# Altium schematic symbol library IC_ADI.SCHLIB: 3169 symbols (part 57 of 181)
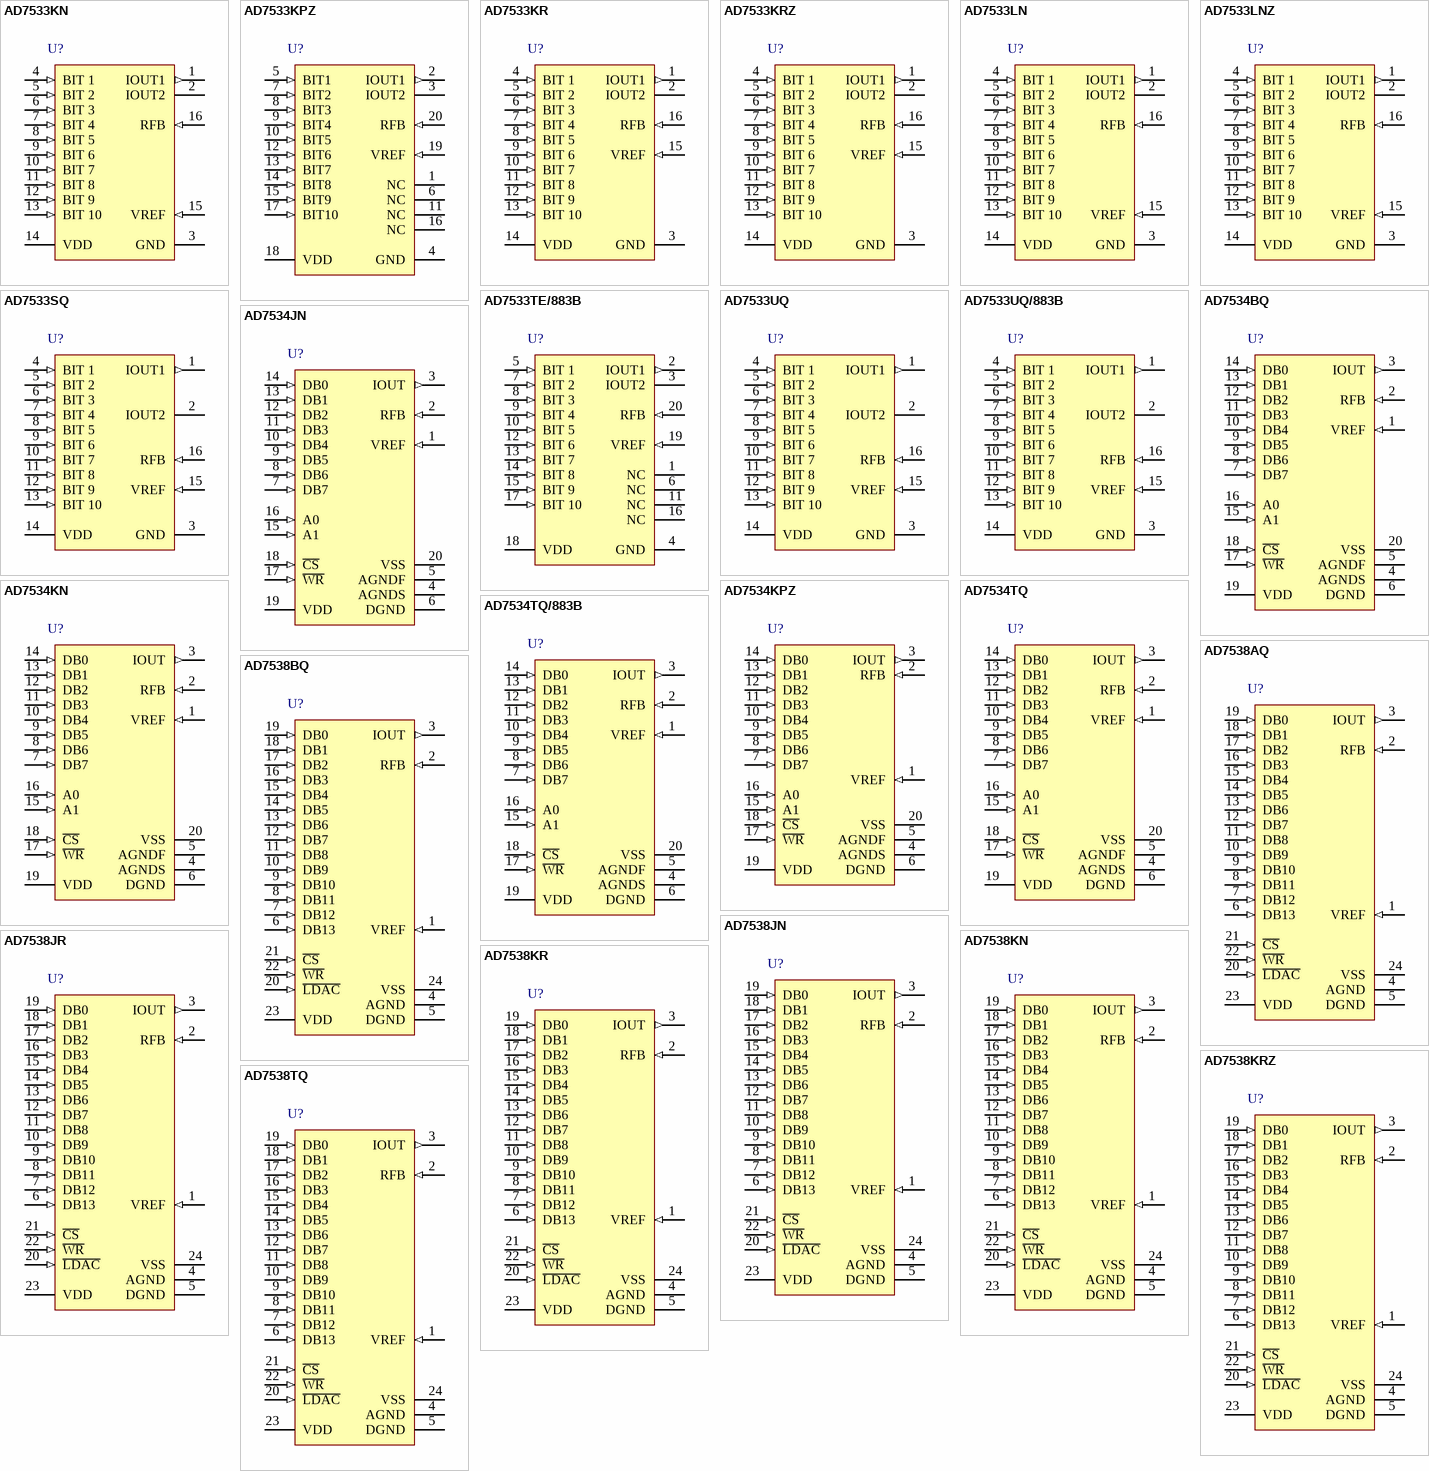
[diagram p247: symbols AD7533KN to AD7538TQ]

## AD7538TQ
designator U?
Single 14-Bit LC2MOS Microprocessor-Compatible Digital-to-Analog Converter, -55 to +125 degC, Q-24-1, Tube; Generic Part Number: AD7538; PartNumber: AD7538TQ; # DAC Outputs: 1; Max V+: 15.75V; Op Pwr Diss: 60mW; Resolution (Bits): 14; Settling Time: 1.5祍; Single Supply: No; DatasheetVersion: Rev.B; PackageVersion: 100808-A; PackageReference: Q-24-1; PackageDescription: 24-Lead Ceramic Dual In-Line Package [CERDIP]; Supplier Part Number 1: AD7538TQ-ND; Supplier Part Number 2: 09B5788; Supplier Part Number 3: 584-AD7538TQ; Packing: Tube; RoHS: N; Mounting Technology: Through Hole; ComponentLink1Description: Manufacturer URL; ComponentLink2Description: Datasheet; ComponentLink3Description: Package Specification; ComponentLink4Description: Product URL
footprint DIP24 (Footprint not found)
pins: 1 VREF (in) "Voltage Reference.", 2 RFB (in) "Feedback Resistor. Used to close the loop around an external op amp.", 3 IOUT (out) "Current Output Terminal.", 4 AGND (power) "Analog Ground", 5 DGND (power) "Digital Ground.", 6 DB13 (in) "Data Input. Bit DB13 (MSB).", 7 DB12 (in) "Data Input.", 8 DB11 (in) "Data Input.", 9 DB10 (in) "Data Input.", 10 DB9 (in) "Data Input.", 11 DB8 (in) "Data Input.", 12 DB7 (in) "Data Input.", 13 DB6 (in) "Data Input.", 14 DB5 (in) "Data Input.", 15 DB4 (in) "Data Input.", 16 DB3 (in) "Data Input.", 17 DB2 (in) "Data Input.", 18 DB1 (in) "Data Input.", 19 DB0 (in) "Data Input. Bit DB0 (LSB).", 20 ~{LDAC} (in) "Chip Select Input. Active low.", 21 ~{CS} (in) "Asynchronous Load DAC Input. Active low.", 22 ~{WR} (in) "Write Input. Active low.", 23 VDD (power) "+12 V to +15 V Supply Input.", 24 VSS (power) "Bias pin for high temperature low leakage configuration. To implement low leakage system, the pin should be at a negative voltage. See Figure 6 and Figure 8 for recommended circuitry."

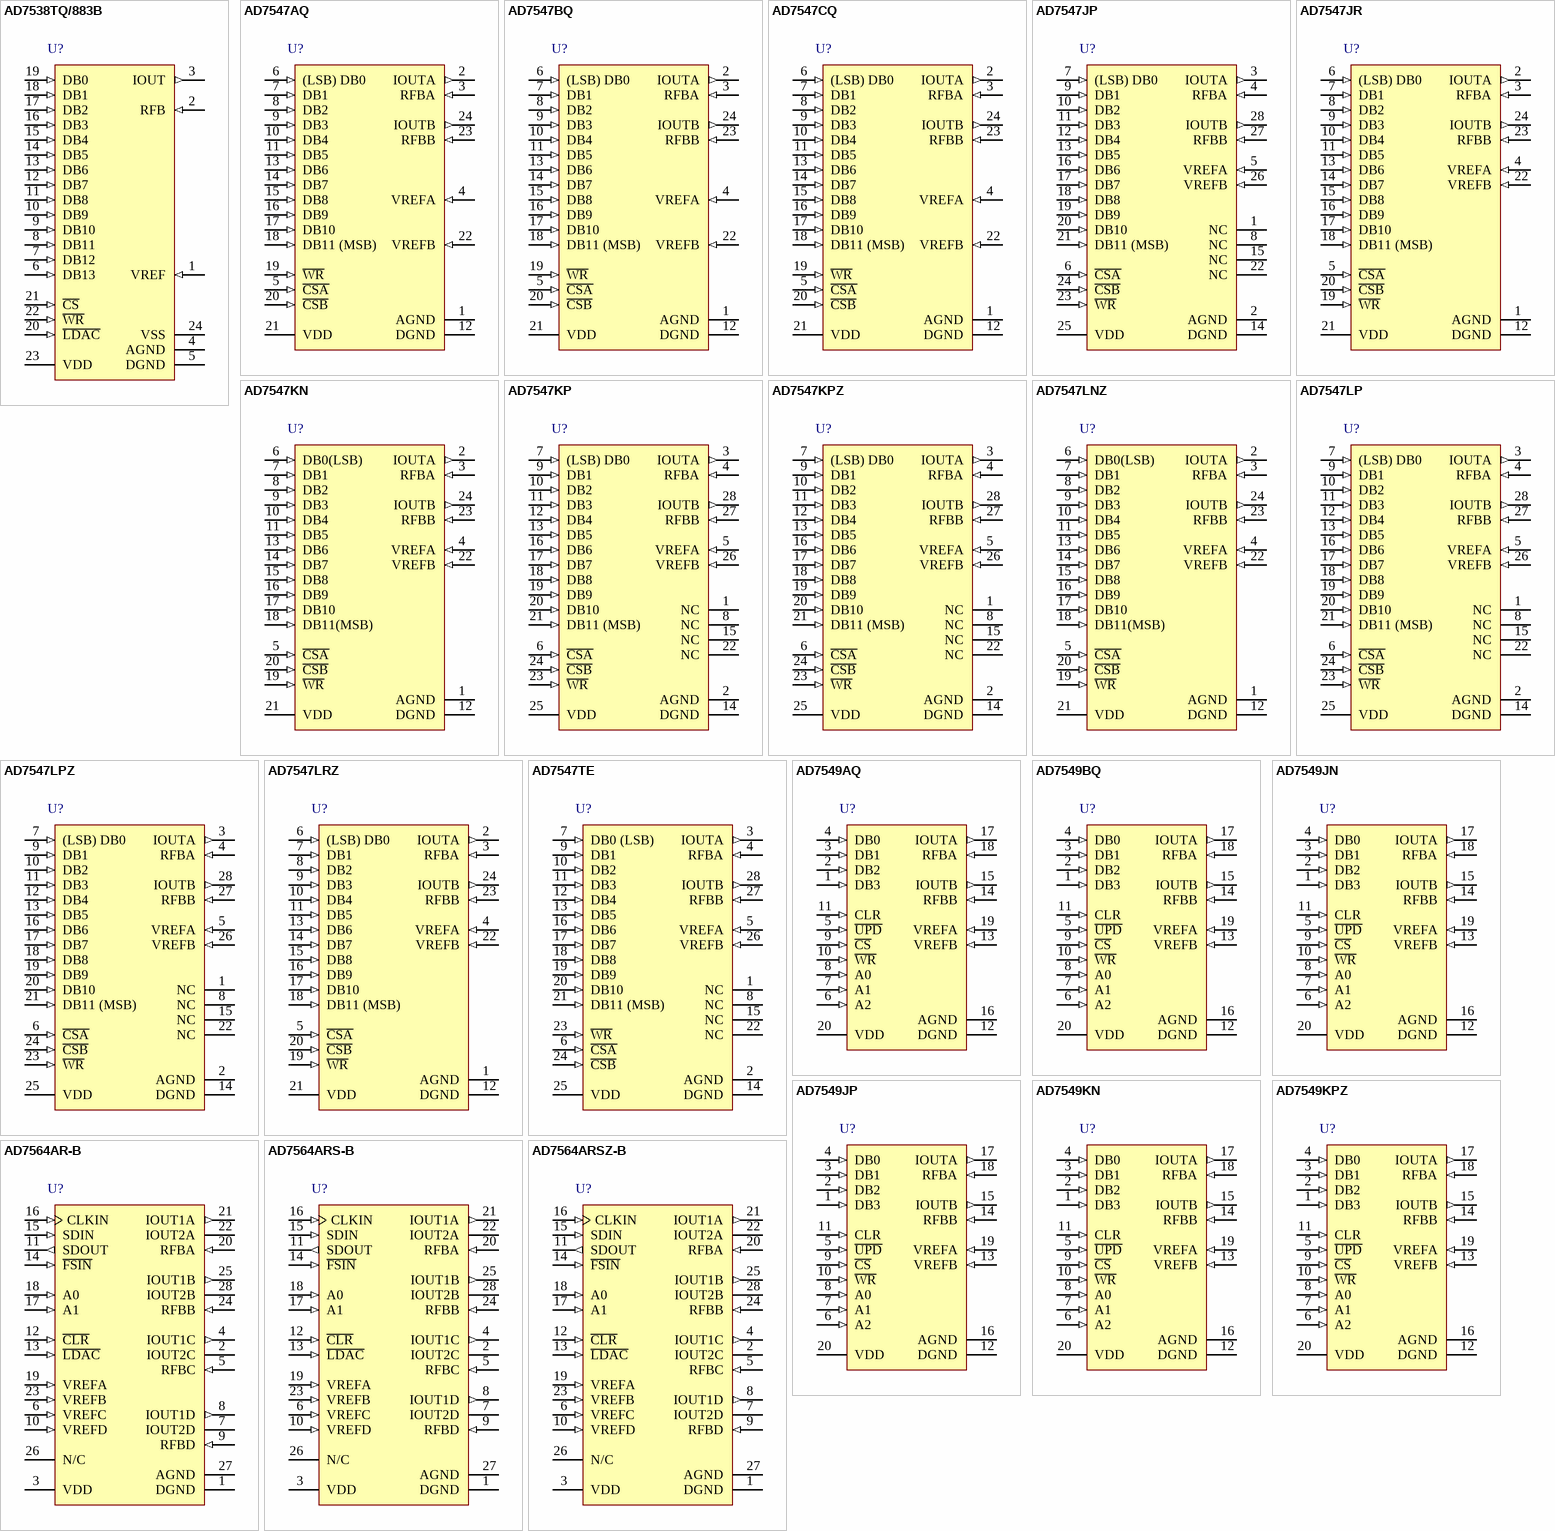
[diagram p48: symbols AD7538TQ/883B to AD7564ARSZ-B]

## AD7538TQ/883B
designator U?
Single 14-Bit LC2MOS Microprocessor-Compatible Digital-to-Analog Converter, -55 to +125 degC, Q-24-1, Tube; Generic Part Number: AD7538; PartNumber: AD7538TQ/883B; # DAC Outputs: 1; Max V+: 15.75V; Op Pwr Diss: 60mW; Resolution (Bits): 14; Settling Time: 1.5祍; Single Supply: No; DatasheetVersion: Rev.B; PackageVersion: 100808-A; PackageReference: Q-24-1; PackageDescription: 24-Lead Ceramic Dual In-Line Package [CERDIP]; Supplier Part Number 1: 584-AD7538TQ883B; Packing: Tube; RoHS: N; Mounting Technology: Through Hole; ComponentLink1Description: Manufacturer URL; ComponentLink2Description: Datasheet; ComponentLink3Description: Package Specification; ComponentLink4Description: Product URL
footprint DIP24 (Footprint not found)
pins: 1 VREF (in) "Voltage Reference.", 2 RFB (in) "Feedback Resistor. Used to close the loop around an external op amp.", 3 IOUT (out) "Current Output Terminal.", 4 AGND (power) "Analog Ground", 5 DGND (power) "Digital Ground.", 6 DB13 (in) "Data Input. Bit DB13 (MSB).", 7 DB12 (in) "Data Input.", 8 DB11 (in) "Data Input.", 9 DB10 (in) "Data Input.", 10 DB9 (in) "Data Input.", 11 DB8 (in) "Data Input.", 12 DB7 (in) "Data Input.", 13 DB6 (in) "Data Input.", 14 DB5 (in) "Data Input.", 15 DB4 (in) "Data Input.", 16 DB3 (in) "Data Input.", 17 DB2 (in) "Data Input.", 18 DB1 (in) "Data Input.", 19 DB0 (in) "Data Input. Bit DB0 (LSB).", 20 ~{LDAC} (in) "Chip Select Input. Active low.", 21 ~{CS} (in) "Asynchronous Load DAC Input. Active low.", 22 ~{WR} (in) "Write Input. Active low.", 23 VDD (power) "+12 V to +15 V Supply Input.", 24 VSS (power) "Bias pin for high temperature low leakage configuration. To implement low leakage system, the pin should be at a negative voltage. See Figure 6 and Figure 8 for recommended circuitry."

## AD7547AQ
designator U?
Dual 12-Bit LC2MOS Digital-to-Analog Converter with Parallel Loading, -40 to +85 degC, Q-24-1, Tube; Generic Part Number: AD7547; PartNumber: AD7547AQ; # DAC Outputs: 2; Max V+: 16.5V; Op Pwr Diss: 30mW; Resolution (Bits): 12; Settling Time: 1.5祍; Single Supply: Yes; DatasheetVersion: Rev.A; PackageVersion: 100808-A; PackageReference: Q-24-1; PackageDescription: 24-Lead Ceramic Dual In-Line Package [CERDIP]; Supplier Part Number 1: AD7547AQ-ND; Supplier Part Number 2: 584-AD7547AQ; Packing: Tube; RoHS: N; Mounting Technology: Through Hole; ComponentLink1Description: Manufacturer URL; ComponentLink2Description: Datasheet; ComponentLink3Description: Package Specification; ComponentLink4Description: Product URL
footprint DIP24 (Footprint not found)
pins: 1 AGND (power) "Analog Ground.", 2 IOUTA (out) "Current output terminal of DACA.", 3 RFBA (in) "Feedback resistor for DACA.", 4 VREFA (in) "Reference input to DACA.", 5 ~{CSA} (in) "Chip Select Input for DACA. Active low.", 6 (LSB) DB0 (in) "Data input.", 7 DB1 (in) "Data input.", 8 DB2 (in) "Data input.", 9 DB3 (in) "Data input.", 10 DB4 (in) "Data input.", 11 DB5 (in) "Data input.", 12 DGND (power) "Digital Ground.", 13 DB6 (in) "Data input.", 14 DB7 (in) "Data input.", 15 DB8 (in) "Data input.", 16 DB9 (in) "Data input.", 17 DB10 (in) "Data input.", 18 DB11 (MSB) (in) "Data input.", 19 ~{WR} (in) "Write Input. Data transfer occurs on rising edge of W\R\. See Table I.", 20 ~{CSB} (in) "Chip Select Input for DACB. Active low.", 21 VDD (power) "Power supply input. Norminally +12V to +15V with + / - 10% tolerance.", 22 VREFB (in) "Reference input to DACB.", 23 RFBB (in) "Feedback resistor of DACB.", 24 IOUTB (out) "Current output terminal of DACB."

## AD7547BQ
designator U?
Dual 12-Bit LC2MOS Digital-to-Analog Converter with Parallel Loading, -40 to +85 degC, Q-24-1, Tube; Generic Part Number: AD7547; PartNumber: AD7547BQ; # DAC Outputs: 2; Max V+: 16.5V; Op Pwr Diss: 30mW; Resolution (Bits): 12; Settling Time: 1.5祍; Single Supply: Yes; DatasheetVersion: Rev.A; PackageVersion: 100808-A; PackageReference: Q-24-1; PackageDescription: 24-Lead Ceramic Dual In-Line Package [CERDIP]; Supplier Part Number 1: AD7547BQ-ND; Supplier Part Number 2: 584-AD7547BQ; Packing: Tube; RoHS: N; Mounting Technology: Through Hole; ComponentLink1Description: Manufacturer URL; ComponentLink2Description: Datasheet; ComponentLink3Description: Package Specification; ComponentLink4Description: Product URL
footprint DIP24 (Footprint not found)
pins: 1 AGND (power) "Analog Ground.", 2 IOUTA (out) "Current output terminal of DACA.", 3 RFBA (in) "Feedback resistor for DACA.", 4 VREFA (in) "Reference input to DACA.", 5 ~{CSA} (in) "Chip Select Input for DACA. Active low.", 6 (LSB) DB0 (in) "Data input.", 7 DB1 (in) "Data input.", 8 DB2 (in) "Data input.", 9 DB3 (in) "Data input.", 10 DB4 (in) "Data input.", 11 DB5 (in) "Data input.", 12 DGND (power) "Digital Ground.", 13 DB6 (in) "Data input.", 14 DB7 (in) "Data input.", 15 DB8 (in) "Data input.", 16 DB9 (in) "Data input.", 17 DB10 (in) "Data input.", 18 DB11 (MSB) (in) "Data input.", 19 ~{WR} (in) "Write Input. Data transfer occurs on rising edge of W\R\. See Table I.", 20 ~{CSB} (in) "Chip Select Input for DACB. Active low.", 21 VDD (power) "Power supply input. Norminally +12V to +15V with + / - 10% tolerance.", 22 VREFB (in) "Reference input to DACB.", 23 RFBB (in) "Feedback resistor of DACB.", 24 IOUTB (out) "Current output terminal of DACB."

## AD7547CQ
designator U?
Dual 12-Bit LC2MOS Digital-to-Analog Converter with Parallel Loading, -40 to +85 degC, Q-24-1, Tube; Generic Part Number: AD7547; PartNumber: AD7547CQ; # DAC Outputs: 2; Max V+: 16.5V; Op Pwr Diss: 30mW; Resolution (Bits): 12; Settling Time: 1.5祍; Single Supply: Yes; DatasheetVersion: Rev.A; PackageVersion: 100808-A; PackageReference: Q-24-1; PackageDescription: 24-Lead Ceramic Dual In-Line Package [CERDIP]; Supplier Part Number 1: AD7547CQ-ND; Supplier Part Number 2: 584-AD7547CQ; Packing: Tube; RoHS: N; Mounting Technology: Through Hole; ComponentLink1Description: Manufacturer URL; ComponentLink2Description: Datasheet; ComponentLink3Description: Package Specification; ComponentLink4Description: Product URL
footprint DIP24 (Footprint not found)
pins: 1 AGND (power) "Analog Ground.", 2 IOUTA (out) "Current output terminal of DACA.", 3 RFBA (in) "Feedback resistor for DACA.", 4 VREFA (in) "Reference input to DACA.", 5 ~{CSA} (in) "Chip Select Input for DACA. Active low.", 6 (LSB) DB0 (in) "Data input.", 7 DB1 (in) "Data input.", 8 DB2 (in) "Data input.", 9 DB3 (in) "Data input.", 10 DB4 (in) "Data input.", 11 DB5 (in) "Data input.", 12 DGND (power) "Digital Ground.", 13 DB6 (in) "Data input.", 14 DB7 (in) "Data input.", 15 DB8 (in) "Data input.", 16 DB9 (in) "Data input.", 17 DB10 (in) "Data input.", 18 DB11 (MSB) (in) "Data input.", 19 ~{WR} (in) "Write Input. Data transfer occurs on rising edge of W\R\. See Table I.", 20 ~{CSB} (in) "Chip Select Input for DACB. Active low.", 21 VDD (power) "Power supply input. Norminally +12V to +15V with + / - 10% tolerance.", 22 VREFB (in) "Reference input to DACB.", 23 RFBB (in) "Feedback resistor of DACB.", 24 IOUTB (out) "Current output terminal of DACB."

## AD7547JP
designator U?
Dual 12-Bit LC2MOS Digital-to-Analog Converter with Parallel Loading, 0 to +70 degC, P-28, Tube; Generic Part Number: AD7547; PartNumber: AD7547JP; # DAC Outputs: 2; Max V+: 16.5V; Op Pwr Diss: 30mW; Resolution (Bits): 12; Settling Time: 1.5祍; Single Supply: Yes; DatasheetVersion: Rev.A; PackageVersion: 042508-A; PackageReference: P-28; PackageDescription: 28-Lead Plastic Leaded Chip Carrier [PLCC]; Supplier Part Number 1: AD7547JP-ND; Supplier Part Number 2: 584-AD7547JP; Packing: Tube; RoHS: N; Mounting Technology: Surface Mount; Code_JEDEC: MO-047-AB; ComponentLink1Description: Manufacturer URL; ComponentLink2Description: Datasheet; ComponentLink3Description: Package Specification; ComponentLink4Description: Product URL
footprint PLCC-28N (Footprint not found)
pins: 1 NC, 2 AGND (power), 3 IOUTA (out), 4 RFBA (in), 5 VREFA (in), 6 ~{CSA} (in), 7 (LSB) DB0 (in), 8 NC, 9 DB1 (in), 10 DB2 (in), 11 DB3 (in), 12 DB4 (in), 13 DB5 (in), 14 DGND (power), 15 NC, 16 DB6 (in), 17 DB7 (in), 18 DB8 (in), 19 DB9 (in), 20 DB10 (in), 21 DB11 (MSB) (in), 22 NC, 23 ~{WR} (in), 24 ~{CSB} (in), 25 VDD (power), 26 VREFB (in), 27 RFBB (in), 28 IOUTB (out)

## AD7547JR
designator U?
Dual 12-Bit LC2MOS Digital-to-Analog Converter with Parallel Loading, 0 to +70 degC, RW-24, Tube; Generic Part Number: AD7547; PartNumber: AD7547JR; # DAC Outputs: 2; Max V+: 16.5V; Op Pwr Diss: 30mW; Resolution (Bits): 12; Settling Time: 1.5祍; Single Supply: Yes; DatasheetVersion: Rev.A; PackageVersion: 060706-A; PackageReference: RW-24; PackageDescription: 24-Lead Standard Small Outline Package [SOIC_W]; Supplier Part Number 1: AD7547JR-ND; Supplier Part Number 2: 584-AD7547JR; Packing: Tube; RoHS: N; Mounting Technology: Surface Mount; Code_JEDEC: MS-013-AD; ComponentLink1Description: Manufacturer URL; ComponentLink2Description: Datasheet; ComponentLink3Description: Package Specification; ComponentLink4Description: Product URL
footprint SOIC24W_1.27 (Footprint not found)
pins: 1 AGND (power) "Analog Ground.", 2 IOUTA (out) "Current output terminal of DACA.", 3 RFBA (in) "Feedback resistor for DACA.", 4 VREFA (in) "Reference input to DACA.", 5 ~{CSA} (in) "Chip Select Input for DACA. Active low.", 6 (LSB) DB0 (in) "Data input.", 7 DB1 (in) "Data input.", 8 DB2 (in) "Data input.", 9 DB3 (in) "Data input.", 10 DB4 (in) "Data input.", 11 DB5 (in) "Data input.", 12 DGND (power) "Digital Ground.", 13 DB6 (in) "Data input.", 14 DB7 (in) "Data input.", 15 DB8 (in) "Data input.", 16 DB9 (in) "Data input.", 17 DB10 (in) "Data input.", 18 DB11 (MSB) (in) "Data input.", 19 ~{WR} (in) "Write Input. Data transfer occurs on rising edge of W\R\. See Table I.", 20 ~{CSB} (in) "Chip Select Input for DACB. Active low.", 21 VDD (power) "Power supply input. Nominally +12V to +15V with + / -10% tolerance.", 22 VREFB (in) "Reference input to DACB.", 23 RFBB (in) "Feedback resistor of DACB.", 24 IOUTB (out) "Current output terminal of DACB."

## AD7547KN
designator U?
Dual 12-Bit LC2MOS Digital-to-Analog Converter with Parallel Loading, 0 to +70 degC, N-24-1, Tube; Generic Part Number: AD7547; PartNumber: AD7547KN; # DAC Outputs: 2; Max V+: 16.5V; Op Pwr Diss: 30mW; Resolution (Bits): 12; Settling Time: 1.5祍; Single Supply: Yes; DatasheetVersion: Rev.A; PackageVersion: 071006-A; PackageReference: N-24-1; PackageDescription: 24-Lead Plastic Dual In-Line Package [PDIP] Narrow Body; Supplier Part Number 1: AD7547KN-ND; Supplier Part Number 2: 584-AD7547KN; Packing: Tube; RoHS: N; Mounting Technology: Through Hole; Code_JEDEC: MS-001; ComponentLink1Description: Manufacturer URL; ComponentLink2Description: Datasheet; ComponentLink3Description: Package Specification; ComponentLink4Description: Product URL
footprint DIP24 (Footprint not found)
pins: 1 AGND (power) "Analog Ground.", 2 IOUTA (out) "Current output terminal of DACA.", 3 RFBA (in) "Feedback resistor for DACA.", 4 VREFA (in) "Reference input to DACA.", 5 ~{CSA} (in) "Chip Select Input for DACA. Active low.", 6 DB0(LSB) (in) "Data input.", 7 DB1 (in) "Data input.", 8 DB2 (in) "Data input.", 9 DB3 (in) "Data input.", 10 DB4 (in) "Data input.", 11 DB5 (in) "Data input.", 12 DGND (power) "Digital Ground.", 13 DB6 (in) "Data input.", 14 DB7 (in) "Data input.", 15 DB8 (in) "Data input.", 16 DB9 (in) "Data input.", 17 DB10 (in) "Data input.", 18 DB11(MSB) (in) "Data input.", 19 ~{WR} (in) "Write Input. Data transfer occurs on rising edge of W\R\. See Table I.", 20 ~{CSB} (in) "Chip Select Input for DACB. Active low.", 21 VDD (power) "Power supply input. Norminally +12V to +15V with + / - 10% tolerance.", 22 VREFB (in) "Reference input to DACB.", 23 RFBB (in) "Feedback resistor of DACB.", 24 IOUTB (out) "Current output terminal of DACB."

## AD7547KP
designator U?
Dual 12-Bit LC2MOS Digital-to-Analog Converter with Parallel Loading, 0 to +70 degC, P-28, Tube; Generic Part Number: AD7547; PartNumber: AD7547KP; # DAC Outputs: 2; Max V+: 16.5V; Op Pwr Diss: 30mW; Resolution (Bits): 12; Settling Time: 1.5祍; Single Supply: Yes; DatasheetVersion: Rev.A; PackageVersion: 042508-A; PackageReference: P-28; PackageDescription: 28-Lead Plastic Leaded Chip Carrier [PLCC]; Supplier Part Number 1: AD7547KP-ND; Supplier Part Number 2: 584-AD7547KP; Packing: Tube; RoHS: N; Mounting Technology: Surface Mount; Code_JEDEC: MO-047-AB; ComponentLink1Description: Manufacturer URL; ComponentLink2Description: Datasheet; ComponentLink3Description: Package Specification; ComponentLink4Description: Product URL
footprint PLCC-28N (Footprint not found)
pins: 1 NC, 2 AGND (power), 3 IOUTA (out), 4 RFBA (in), 5 VREFA (in), 6 ~{CSA} (in), 7 (LSB) DB0 (in), 8 NC, 9 DB1 (in), 10 DB2 (in), 11 DB3 (in), 12 DB4 (in), 13 DB5 (in), 14 DGND (power), 15 NC, 16 DB6 (in), 17 DB7 (in), 18 DB8 (in), 19 DB9 (in), 20 DB10 (in), 21 DB11 (MSB) (in), 22 NC, 23 ~{WR} (in), 24 ~{CSB} (in), 25 VDD (power), 26 VREFB (in), 27 RFBB (in), 28 IOUTB (out)

## AD7547KPZ
designator U?
Dual 12-Bit LC2MOS Digital-to-Analog Converter with Parallel Loading, 0 to +70 degC, P-28, Pb-Free, Tube; Generic Part Number: AD7547; PartNumber: AD7547KPZ; # DAC Outputs: 2; Max V+: 16.5V; Op Pwr Diss: 30mW; Resolution (Bits): 12; Settling Time: 1.5祍; Single Supply: Yes; DatasheetVersion: Rev.A; PackageVersion: 042508-A; PackageReference: P-28; PackageDescription: 28-Lead Plastic Leaded Chip Carrier [PLCC]; Supplier Part Number 1: AD7547KPZ-ND; Supplier Part Number 2: 584-AD7547KPZ; Packing: Tube; RoHS: Y; Mounting Technology: Surface Mount; Code_JEDEC: MO-047-AB; ComponentLink1Description: Manufacturer URL; ComponentLink2Description: Datasheet; ComponentLink3Description: Package Specification; ComponentLink4Description: Product URL
footprint PLCC-28N (Footprint not found)
pins: 1 NC, 2 AGND (power), 3 IOUTA (out), 4 RFBA (in), 5 VREFA (in), 6 ~{CSA} (in), 7 (LSB) DB0 (in), 8 NC, 9 DB1 (in), 10 DB2 (in), 11 DB3 (in), 12 DB4 (in), 13 DB5 (in), 14 DGND (power), 15 NC, 16 DB6 (in), 17 DB7 (in), 18 DB8 (in), 19 DB9 (in), 20 DB10 (in), 21 DB11 (MSB) (in), 22 NC, 23 ~{WR} (in), 24 ~{CSB} (in), 25 VDD (power), 26 VREFB (in), 27 RFBB (in), 28 IOUTB (out)

## AD7547LNZ
designator U?
Dual 12-Bit LC2MOS Digital-to-Analog Converter with Parallel Loading, 0 to +70 degC, N-24-1, Pb-Free, Tube; Generic Part Number: AD7547; PartNumber: AD7547LNZ; # DAC Outputs: 2; Max V+: 16.5V; Op Pwr Diss: 30mW; Resolution (Bits): 12; Settling Time: 1.5祍; Single Supply: Yes; DatasheetVersion: Rev.A; PackageVersion: 071006-A; PackageReference: N-24-1; PackageDescription: 24-Lead Plastic Dual In-Line Package [PDIP] Narrow Body; Supplier Part Number 1: AD7547LNZ-ND; Supplier Part Number 2: 584-AD7547LNZ; Packing: Tube; RoHS: Y; Mounting Technology: Through Hole; Code_JEDEC: MS-001; ComponentLink1Description: Manufacturer URL; ComponentLink2Description: Datasheet; ComponentLink3Description: Package Specification; ComponentLink4Description: Product URL
footprint DIP24 (Footprint not found)
pins: 1 AGND (power) "Analog Ground.", 2 IOUTA (out) "Current output terminal of DACA.", 3 RFBA (in) "Feedback resistor for DACA.", 4 VREFA (in) "Reference input to DACA.", 5 ~{CSA} (in) "Chip Select Input for DACA. Active low.", 6 DB0(LSB) (in) "Data input.", 7 DB1 (in) "Data input.", 8 DB2 (in) "Data input.", 9 DB3 (in) "Data input.", 10 DB4 (in) "Data input.", 11 DB5 (in) "Data input.", 12 DGND (power) "Digital Ground.", 13 DB6 (in) "Data input.", 14 DB7 (in) "Data input.", 15 DB8 (in) "Data input.", 16 DB9 (in) "Data input.", 17 DB10 (in) "Data input.", 18 DB11(MSB) (in) "Data input.", 19 ~{WR} (in) "Write Input. Data transfer occurs on rising edge of W\R\. See Table I.", 20 ~{CSB} (in) "Chip Select Input for DACB. Active low.", 21 VDD (power) "Power supply input. Norminally +12V to +15V with + / - 10% tolerance.", 22 VREFB (in) "Reference input to DACB.", 23 RFBB (in) "Feedback resistor of DACB.", 24 IOUTB (out) "Current output terminal of DACB."

## AD7547LP
designator U?
Dual 12-Bit LC2MOS Digital-to-Analog Converter with Parallel Loading, 0 to +70 degC, P-28, Tube; Generic Part Number: AD7547; PartNumber: AD7547LP; # DAC Outputs: 2; Max V+: 16.5V; Op Pwr Diss: 30mW; Resolution (Bits): 12; Settling Time: 1.5祍; Single Supply: Yes; DatasheetVersion: Rev.A; PackageVersion: 042508-A; PackageReference: P-28; PackageDescription: 28-Lead Plastic Leaded Chip Carrier [PLCC]; Supplier Part Number 1: AD7547LP-ND; Supplier Part Number 2: 584-AD7547LP; Packing: Tube; RoHS: N; Mounting Technology: Surface Mount; Code_JEDEC: MO-047-AB; ComponentLink1Description: Manufacturer URL; ComponentLink2Description: Datasheet; ComponentLink3Description: Package Specification; ComponentLink4Description: Product URL
footprint PLCC-28N (Footprint not found)
pins: 1 NC, 2 AGND (power), 3 IOUTA (out), 4 RFBA (in), 5 VREFA (in), 6 ~{CSA} (in), 7 (LSB) DB0 (in), 8 NC, 9 DB1 (in), 10 DB2 (in), 11 DB3 (in), 12 DB4 (in), 13 DB5 (in), 14 DGND (power), 15 NC, 16 DB6 (in), 17 DB7 (in), 18 DB8 (in), 19 DB9 (in), 20 DB10 (in), 21 DB11 (MSB) (in), 22 NC, 23 ~{WR} (in), 24 ~{CSB} (in), 25 VDD (power), 26 VREFB (in), 27 RFBB (in), 28 IOUTB (out)

## AD7547LPZ
designator U?
Dual 12-Bit LC2MOS Digital-to-Analog Converter with Parallel Loading, 0 to +70 degC, P-28, Pb-Free, Tube; Generic Part Number: AD7547; PartNumber: AD7547LPZ; # DAC Outputs: 2; Max V+: 16.5V; Op Pwr Diss: 30mW; Resolution (Bits): 12; Settling Time: 1.5祍; Single Supply: Yes; DatasheetVersion: Rev.A; PackageVersion: 042508-A; PackageReference: P-28; PackageDescription: 28-Lead Plastic Leaded Chip Carrier [PLCC]; Supplier Part Number 1: AD7547LPZ-ND; Supplier Part Number 2: 584-AD7547LPZ; Packing: Tube; RoHS: Y; Mounting Technology: Surface Mount; Code_JEDEC: MO-047-AB; ComponentLink1Description: Manufacturer URL; ComponentLink2Description: Datasheet; ComponentLink3Description: Package Specification; ComponentLink4Description: Product URL
footprint PLCC-28N (Footprint not found)
pins: 1 NC, 2 AGND (power), 3 IOUTA (out), 4 RFBA (in), 5 VREFA (in), 6 ~{CSA} (in), 7 (LSB) DB0 (in), 8 NC, 9 DB1 (in), 10 DB2 (in), 11 DB3 (in), 12 DB4 (in), 13 DB5 (in), 14 DGND (power), 15 NC, 16 DB6 (in), 17 DB7 (in), 18 DB8 (in), 19 DB9 (in), 20 DB10 (in), 21 DB11 (MSB) (in), 22 NC, 23 ~{WR} (in), 24 ~{CSB} (in), 25 VDD (power), 26 VREFB (in), 27 RFBB (in), 28 IOUTB (out)

## AD7547LRZ
designator U?
Dual 12-Bit LC2MOS Digital-to-Analog Converter with Parallel Loading, 0 to +70 degC, RW-24, Pb-Free, Tube; Generic Part Number: AD7547; PartNumber: AD7547LRZ; # DAC Outputs: 2; Max V+: 16.5V; Op Pwr Diss: 30mW; Resolution (Bits): 12; Settling Time: 1.5祍; Single Supply: Yes; DatasheetVersion: Rev.A; PackageVersion: 060706-A; PackageReference: RW-24; PackageDescription: 24-Lead Standard Small Outline Package [SOIC_W]; Supplier Part Number 1: AD7547LRZ-ND; Supplier Part Number 2: 584-AD7547LRZ; Packing: Tube; RoHS: Y; Mounting Technology: Surface Mount; Code_JEDEC: MS-013-AD; ComponentLink1Description: Manufacturer URL; ComponentLink2Description: Datasheet; ComponentLink3Description: Package Specification; ComponentLink4Description: Product URL
footprint SOIC24W_1.27 (Footprint not found)
pins: 1 AGND (power) "Analog Ground.", 2 IOUTA (out) "Current output terminal of DACA.", 3 RFBA (in) "Feedback resistor for DACA.", 4 VREFA (in) "Reference input to DACA.", 5 ~{CSA} (in) "Chip Select Input for DACA. Active low.", 6 (LSB) DB0 (in) "Data input.", 7 DB1 (in) "Data input.", 8 DB2 (in) "Data input.", 9 DB3 (in) "Data input.", 10 DB4 (in) "Data input.", 11 DB5 (in) "Data input.", 12 DGND (power) "Digital Ground.", 13 DB6 (in) "Data input.", 14 DB7 (in) "Data input.", 15 DB8 (in) "Data input.", 16 DB9 (in) "Data input.", 17 DB10 (in) "Data input.", 18 DB11 (MSB) (in) "Data input.", 19 ~{WR} (in) "Write Input. Data transfer occurs on rising edge of W\R\. See Table I.", 20 ~{CSB} (in) "Chip Select Input for DACB. Active low.", 21 VDD (power) "Power supply input. Nominally +12V to +15V with + / -10% tolerance.", 22 VREFB (in) "Reference input to DACB.", 23 RFBB (in) "Feedback resistor of DACB.", 24 IOUTB (out) "Current output terminal of DACB."

## AD7547TE
designator U?
Dual 12-Bit LC2MOS Digital-to-Analog Converter with Parallel Loading, -55 to +125 degC, E-28-1, Tube; Generic Part Number: AD7547; PartNumber: AD7547TE; # DAC Outputs: 2; Max V+: 16.5V; Op Pwr Diss: 30mW; Resolution (Bits): 12; Settling Time: 1.5祍; Single Supply: Yes; DatasheetVersion: Rev.A; PackageVersion: 022106-A; PackageReference: E-28-1; PackageDescription: 28-Terminal Ceramic Leadless Chip Carrier [LCC]; Supplier Part Number 1: N/A; Packing: Tube; RoHS: N; Mounting Technology: Surface Mount; ComponentLink1Description: Manufacturer URL; ComponentLink2Description: Datasheet; ComponentLink3Description: Package Specification; ComponentLink4Description: Product URL
footprint PLCC-28N (Footprint not found)
pins: 1 NC "No connect.", 2 AGND (power) "Analog Ground.", 3 IOUTA (out) "Current output terminal of DACA.", 4 RFBA (in) "Feedback resistor for DACA.", 5 VREFA (in) "Reference input to DACA.", 6 ~{CSA} (in) "Chip Select Input for DACA.Active low.", 7 DB0 (LSB) (in) "Data input.", 8 NC "No connect.", 9 DB1 (in) "Data input.", 10 DB2 (in) "Data input.", 11 DB3 (in) "Data input.", 12 DB4 (in) "Data input.", 13 DB5 (in) "Data input.", 14 DGND (power) "Digital Ground.", 15 NC "No connect.", 16 DB6 (in) "Data input.", 17 DB7 (in) "Data input.", 18 DB8 (in) "Data input.", 19 DB9 (in) "Data input.", 20 DB10 (in) "Data input.", 21 DB11 (MSB) (in) "Data input.", 22 NC "No connect.", 23 ~{WR} (in) "Write input.Data transfer occurs on rising edge of W\R\.", 24 ~{CSB} (in) "Chip Select Input for DACB.Active low.", 25 VDD (power) "Power supply input.Nominally +12V to +15V with +/- 10% tolerance.", 26 VREFB (in) "Reference input to DACB.", 27 RFBB (in) "Feedback resistor of DACB.", 28 IOUTB (out) "Current output terminal of DACB."

## AD7549AQ
designator U?
Dual 12-Bit uP-Compatible Digital-to-Analog Converter, -40 to +85 degC, Q-20, Tube; Generic Part Number: AD7549; PartNumber: AD7549AQ; # DAC Outputs: 2; Max V+: 15.75V; Op Pwr Diss: 75mW; Resolution (Bits): 12; Settling Time: 1.5祍; Single Supply: Yes; DatasheetVersion: Rev.A; PackageVersion: Dec-2004; PackageReference: Q-20; PackageDescription: 20-Lead Ceramic Dual In-Line Package [CERDIP]; Supplier Part Number 1: AD7549AQ-ND; Supplier Part Number 2: 584-AD7549AQ; Packing: Tube; RoHS: N; Mounting Technology: Through Hole; ComponentLink1Description: Manufacturer URL; ComponentLink2Description: Datasheet; ComponentLink3Description: Package Specification; ComponentLink4Description: Product URL
footprint DIP20 (Footprint not found)
pins: 1 DB3 (in) "Data Bit 3, Data Bit 7 or Data Bit 11(MSB)", 2 DB2 (in) "Data Bit 2, Data Bit 6 or Data Bit 10.", 3 DB1 (in) "Data Bit 1, Data Bit 5 or Data Bit 9.", 4 DB0 (in) "Data Bit 0, Data Bit 4 or Data Bit 8.", 5 ~{UPD} (in) "Updates DAC Registers from 4-bit input registers. DAC A and DAC B both updated simultaneously.", 6 A2 (in) "Address line 2.", 7 A1 (in) "Address line 1.", 8 A0 (in) "Address line 0.", 9 ~{CS} (in) "Chip Select Input. Active low.", 10 ~{WR} (in) "Write Input. Active low.", 11 CLR (in) "Clear Input. Active High. Clears all registers.", 12 DGND (power) "Digital Ground.", 13 VREFB (in) "Voltage reference input to DAC B.", 14 RFBB (in) "Feedback resistor of DAC B.", 15 IOUTB (out) "Current output terminal of DAC B.", 16 AGND (power) "Analog ground.", 17 IOUTA (out) "Current output terminal of DAC A.", 18 RFBA (in) "Feedback resistor of DAC A.", 19 VREFA (in) "Voltage reference input to DAC A.", 20 VDD (power) "+15 V supply input."

## AD7549BQ
designator U?
Dual 12-Bit uP-Compatible Digital-to-Analog Converter, -40 to +85 degC, Q-20, Tube; Generic Part Number: AD7549; PartNumber: AD7549BQ; # DAC Outputs: 2; Max V+: 15.75V; Op Pwr Diss: 75mW; Resolution (Bits): 12; Settling Time: 1.5祍; Single Supply: Yes; DatasheetVersion: Rev.A; PackageVersion: Dec-2004; PackageReference: Q-20; PackageDescription: 20-Lead Ceramic Dual In-Line Package [CERDIP]; Supplier Part Number 1: AD7549BQ-ND; Supplier Part Number 2: 584-AD7549BQ; Packing: Tube; RoHS: N; Mounting Technology: Through Hole; ComponentLink1Description: Manufacturer URL; ComponentLink2Description: Datasheet; ComponentLink3Description: Package Specification; ComponentLink4Description: Product URL
footprint DIP20 (Footprint not found)
pins: 1 DB3 (in) "Data Bit 3, Data Bit 7 or Data Bit 11(MSB)", 2 DB2 (in) "Data Bit 2, Data Bit 6 or Data Bit 10.", 3 DB1 (in) "Data Bit 1, Data Bit 5 or Data Bit 9.", 4 DB0 (in) "Data Bit 0, Data Bit 4 or Data Bit 8.", 5 ~{UPD} (in) "Updates DAC Registers from 4-bit input registers. DAC A and DAC B both updated simultaneously.", 6 A2 (in) "Address line 2.", 7 A1 (in) "Address line 1.", 8 A0 (in) "Address line 0.", 9 ~{CS} (in) "Chip Select Input. Active low.", 10 ~{WR} (in) "Write Input. Active low.", 11 CLR (in) "Clear Input. Active High. Clears all registers.", 12 DGND (power) "Digital Ground.", 13 VREFB (in) "Voltage reference input to DAC B.", 14 RFBB (in) "Feedback resistor of DAC B.", 15 IOUTB (out) "Current output terminal of DAC B.", 16 AGND (power) "Analog ground.", 17 IOUTA (out) "Current output terminal of DAC A.", 18 RFBA (in) "Feedback resistor of DAC A.", 19 VREFA (in) "Voltage reference input to DAC A.", 20 VDD (power) "+15 V supply input."

## AD7549JN
designator U?
Dual 12-Bit uP-Compatible Digital-to-Analog Converter, 0 to +70 degC, N-20, Tube; Generic Part Number: AD7549; PartNumber: AD7549JN; # DAC Outputs: 2; Max V+: 15.75V; Op Pwr Diss: 75mW; Resolution (Bits): 12; Settling Time: 1.5祍; Single Supply: Yes; DatasheetVersion: Rev.A; PackageVersion: 070706-A; PackageReference: N-20; PackageDescription: 20-Lead Plastic Dual In-Line Package [PDIP] Narrow Body; Supplier Part Number 1: AD7549JN-ND; Supplier Part Number 2: 584-AD7549JN; Packing: Tube; RoHS: N; Mounting Technology: Through Hole; Code_JEDEC: MS-001; ComponentLink1Description: Manufacturer URL; ComponentLink2Description: Datasheet; ComponentLink3Description: Package Specification; ComponentLink4Description: Product URL
footprint DIP20 (Footprint not found)
pins: 1 DB3 (in) "Data Bit 3,Data Bit 7 or Data Bit 11 (MSB)", 2 DB2 (in) "Data Bit 2,Data Bit 6 or Data Bit 10.", 3 DB1 (in) "Data Bit 1,Data Bit 5 or Data Bit 9.", 4 DB0 (in) "Data Bit 0,Data Bit 4 or Data Bit 8.", 5 ~{UPD} (in) "Updates DAC Registers from 4-bit input registers.DAC A and DAC B both updated simultaneously.", 6 A2 (in) "Address line 2.", 7 A1 (in) "Address line 1.", 8 A0 (in) "Address line 0.", 9 ~{CS} (in) "Chip Sekect Input.Active low.", 10 ~{WR} (in) "Write Input.Active low.", 11 CLR (in) "Clear Input.Active High.Clears all registers.", 12 DGND (power) "Digital Ground.", 13 VREFB (in) "Voltage reference input to DAC B.", 14 RFBB (in) "Feedback resistor of DAC B.", 15 IOUTB (out) "Current output terminal of DAC B.", 16 AGND (power) "Analog ground.", 17 IOUTA (out) "Current output terminal of DAC A.", 18 RFBA (in) "Feedback resistor of DAC A.", 19 VREFA (in) "Voltage reference input to DAC A.", 20 VDD (power) "+15 V supply input."
